# Altium footprint library PcbLib_ICs_part2.PcbLib: 66 footprints (part 4 of 5)
Each footprint in its own frame and in the unit in brackets; x right, y up, seen from the top. Pads: shape width x height; smd on the part's side, far side on the other; paste and mask are expansions set on the pad; w line width, h text height; cw(c..) or ccw(c..) is an arc to the next point about the centre after c.
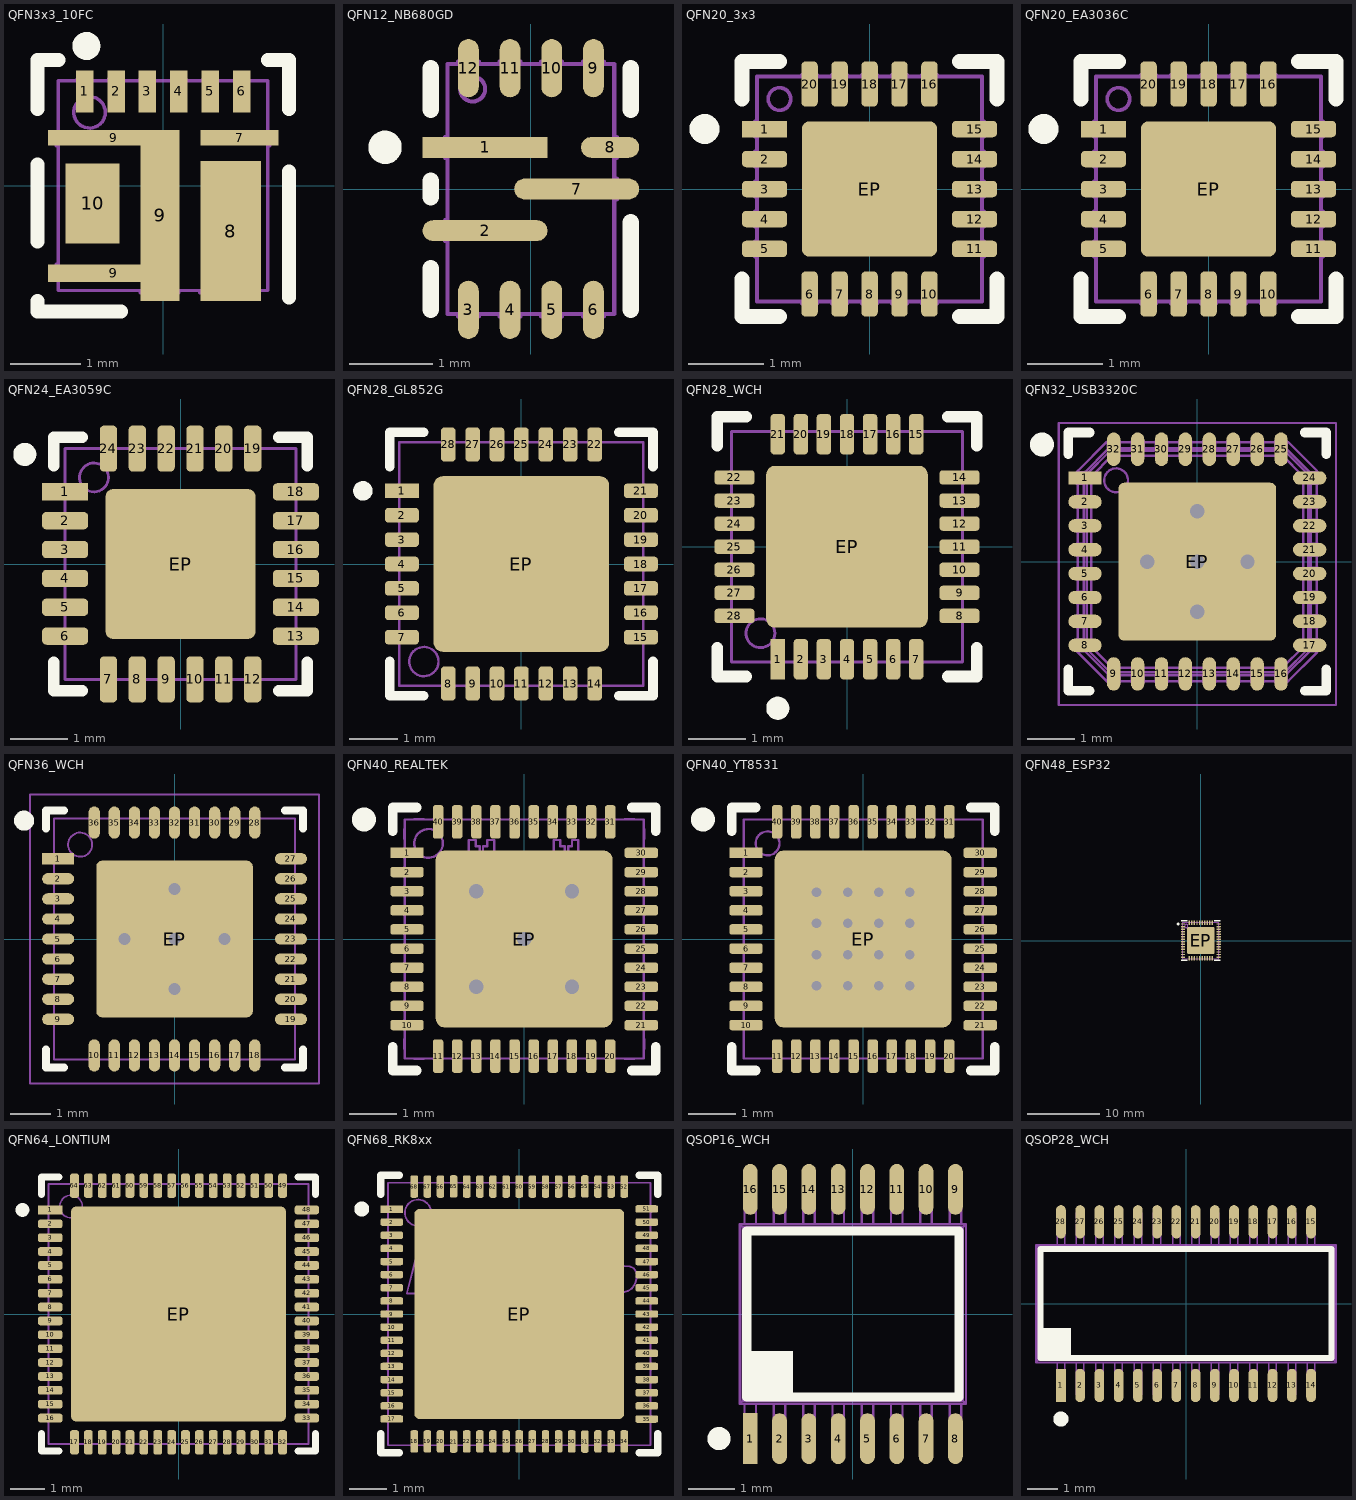
[diagram p3: the footprints below, top view; thin cyan lines are the x and y axes]

## QFN3x3_10FC [mm] "Power QFN 3mm x 3mm"
pads (12):
  rect 0.25x0.6 smd paste-0.025 mask+0.05: 1(-1.125,1.35) 2(-0.675,1.35) 3(-0.225,1.35) 4(0.225,1.35) 5(0.675,1.35) 6(1.125,1.35)
  rect 1.122x0.225 smd paste-0.025 mask+0.05: 7(1.093,0.687)
  rect 0.87x2 smd paste-3 mask+0.05: 8(0.967,-0.65)
  rect 1.88x0.25 smd paste-3 mask+0.05: 9(-0.71,-1.255)
  rect 1.88x0.225 smd paste-3 mask+0.05: 9(-0.71,0.687)
  rect 0.555x2.45 smd paste-3 mask+0.05: 9(-0.045,-0.425)
  rect 0.775x1.15 smd paste-3 mask+0.05: 10(-1.01,-0.255)
Top Overlay:
  circle w0.2: c-1.1,2 r0.1
  lines w0.2: -1.8,-1.65 -1.8,-1.8 -0.6,-1.8 ; -1.8,-0.8 -1.8,0.3 ; -1.8,1.1 -1.8,1.8 -1.5,1.8 ; 1.5,1.8 1.8,1.8 1.8,1.1 ; 1.8,-1.6 1.8,0.2
Top Paste:
  rectangle: -0.838,-1.357 -0.438,-1.157
  rectangle: -1.338,-1.357 -0.938,-1.157
  rectangle: -0.838,0.588 -0.438,0.788
  rectangle: -1.338,0.588 -0.938,0.788
  region: 1.3,-1.05 0.65,-1.05 0.65,-1.45 1.3,-1.45
  rectangle: 0.65,-0.85 1.3,-0.45
  rectangle: 0.65,-0.25 1.3,0.15
  rectangle: -0.25,-1.45 0.15,-1.05
  rectangle: -0.25,-0.85 0.15,-0.45
  rectangle: -0.25,-0.25 0.15,0.15
  rectangle: -0.25,0.35 0.15,0.75
  rectangle: -1.3,-0.75 -0.7,-0.35
  rectangle: -1.3,-0.15 -0.7,0.25
Top Assy:
  circle w0.05: c-1.053,1.049 r0.225
  lines w0.05: -1.503,-1.326 -1.533,-1.326 -1.533,-1.126 -1.503,-1.126 ; -1.503,0.574 -1.533,0.574 -1.533,0.774 -1.503,0.774 ; -1.228,1.499 -1.228,1.529 -1.028,1.529 -1.028,1.499 ; -0.778,1.499 -0.778,1.529 -0.578,1.529 -0.578,1.499 ; -0.328,-1.501 -0.328,-1.531 0.227,-1.531 0.227,-1.501 ; -0.328,1.499 -0.328,1.529 -0.128,1.529 -0.128,1.499 ; 0.122,1.499 0.122,1.529 0.322,1.529 0.322,1.499 ; 0.527,-1.501 0.527,-1.531 1.247,-1.531 1.247,-1.501 ; 0.572,1.499 0.572,1.529 0.772,1.529 0.772,1.499 ; 1.022,1.499 1.022,1.529 1.222,1.529 1.222,1.499 ; 1.497,0.574 1.527,0.574 1.527,0.774 1.497,0.774 ; -1.503,-1.501 -1.503,1.499 1.497,1.499 1.497,-1.501 -1.503,-1.501
  text ".Designator" at -3.443,-0.467 h2
3D body "QFN3x3_10_FC.STEP": height 0.85, standoff 0, extent -1.53,-1.53 1.53,1.53

## QFN12_NB680GD [mm] "Power QFN 2mm x 3mm"
pads (12):
  rect 1.5x0.25 smd paste-0.025 mask+0.05: 1(-0.55,0.5)
  oval 1.5x0.25 smd paste-0.025 mask+0.05: 2(-0.55,-0.5) 7(0.55,0)
  oval 0.25x0.7 smd paste-0.025 mask+0.05: 3(-0.75,-1.45) 4(-0.25,-1.45) 5(0.25,-1.45) 6(0.75,-1.45) 9(0.75,1.45) 10(0.25,1.45) 11(-0.25,1.45) 12(-0.75,1.45)
  oval 0.7x0.25 smd paste-0.025 mask+0.05: 8(0.95,0.5)
Top Overlay:
  circle w0.2: c-1.75,0.5 r0.1
  lines w0.2: -1.2,-1.45 -1.2,-0.95 ; -1.2,-0.1 -1.2,0.1 ; -1.2,0.95 -1.2,1.45 ; 1.2,-1.45 1.2,-0.4 ; 1.2,0.95 1.2,1.45
Top Assy:
  circle w0.05: c-0.7,1.2 r0.15
  lines w0.05: -1,-0.625 -1.03,-0.625 -1.03,-0.375 -1,-0.375 ; -1,0.375 -1.03,0.375 -1.03,0.625 -1,0.625 ; -0.875,-1.5 -0.875,-1.53 -0.625,-1.53 -0.625,-1.5 ; -0.875,1.5 -0.875,1.53 -0.625,1.53 -0.625,1.5 ; -0.375,-1.5 -0.375,-1.53 -0.125,-1.53 -0.125,-1.5 ; -0.375,1.5 -0.375,1.53 -0.125,1.53 -0.125,1.5 ; 0.125,-1.5 0.125,-1.53 0.375,-1.53 0.375,-1.5 ; 0.125,1.5 0.125,1.53 0.375,1.53 0.375,1.5 ; 0.625,-1.5 0.625,-1.53 0.875,-1.53 0.875,-1.5 ; 0.625,1.5 0.625,1.53 0.875,1.53 0.875,1.5 ; 1,-0.125 1.03,-0.125 1.03,0.125 1,0.125 ; 1,0.375 1.03,0.375 1.03,0.625 1,0.625 ; -1,-1.5 1,-1.5 1,1.5 -1,1.5 -1,-1.5
  text ".Designator" at 0.349,-2.579 h1.5
3D body "QFN-12(NB679).STEP": height 1, standoff 0, extent -1.03,-1.53 1.03,1.53

## QFN20_3x3 [mm] "Power QFN 3mm x 3mm, 0.4mm pitch"
pads (21):
  rect 0.6x0.22 smd paste-0.025 mask+0.05: 1(-1.4,0.8)
  rrect50% 0.6x0.22 smd paste-0.025 mask+0.05: 2(-1.4,0.4) 3(-1.4,0) 4(-1.4,-0.4) 5(-1.4,-0.8) 11(1.4,-0.8) 12(1.4,-0.4) 13(1.4,0) 14(1.4,0.4) 15(1.4,0.8)
  rrect50% 0.22x0.6 smd paste-0.025 mask+0.05: 6(-0.8,-1.4) 7(-0.4,-1.4) 8(0,-1.4) 9(0.4,-1.4) 10(0.8,-1.4) 16(0.8,1.4) 17(0.4,1.4) 18(0,1.4) 19(-0.4,1.4) 20(-0.8,1.4)
  rrect10% 1.8x1.8 smd paste-3 mask+0.05: EP(0,0)
Top Overlay:
  circle w0.2: c-2.2,0.8 r0.1
  lines w0.2: -1.7,-1.2 -1.7,-1.7 -1.2,-1.7 ; -1.7,1.2 -1.7,1.7 -1.2,1.7 ; 1.2,-1.7 1.7,-1.7 1.7,-1.2 ; 1.2,1.7 1.7,1.7 1.7,1.2
Top Paste:
  region: -0.1,-0.1 -0.7,-0.1 -0.7,-0.7 -0.1,-0.7
  region: 0.7,-0.1 0.1,-0.1 0.1,-0.7 0.7,-0.7
  region: -0.1,0.7 -0.7,0.7 -0.7,0.1 -0.1,0.1
  region: 0.7,0.7 0.1,0.7 0.1,0.1 0.7,0.1
Top Assy:
  circle w0.05: c-1.2,1.2 r0.15
  lines w0.05: -1.5,-0.9 -1.525,-0.9 -1.525,-0.7 -1.5,-0.7 ; -1.5,-0.5 -1.525,-0.5 -1.525,-0.3 -1.5,-0.3 ; -1.5,-0.1 -1.525,-0.1 -1.525,0.1 -1.5,0.1 ; -1.5,0.3 -1.525,0.3 -1.525,0.5 -1.5,0.5 ; -1.5,0.7 -1.525,0.7 -1.525,0.9 -1.5,0.9 ; -0.9,-1.5 -0.9,-1.525 -0.7,-1.525 -0.7,-1.5 ; -0.9,1.5 -0.9,1.525 -0.7,1.525 -0.7,1.5 ; -0.5,-1.5 -0.5,-1.525 -0.3,-1.525 -0.3,-1.5 ; -0.5,1.5 -0.5,1.525 -0.3,1.525 -0.3,1.5 ; -0.1,-1.5 -0.1,-1.525 0.1,-1.525 0.1,-1.5 ; -0.1,1.5 -0.1,1.525 0.1,1.525 0.1,1.5 ; 0.3,-1.5 0.3,-1.525 0.5,-1.525 0.5,-1.5 ; 0.3,1.5 0.3,1.525 0.5,1.525 0.5,1.5 ; 0.7,-1.5 0.7,-1.525 0.9,-1.525 0.9,-1.5 ; 0.7,1.5 0.7,1.525 0.9,1.525 0.9,1.5 ; 1.5,-0.9 1.525,-0.9 1.525,-0.7 1.5,-0.7 ; 1.5,-0.5 1.525,-0.5 1.525,-0.3 1.5,-0.3 ; 1.5,-0.1 1.525,-0.1 1.525,0.1 1.5,0.1 ; 1.5,0.3 1.525,0.3 1.525,0.5 1.5,0.5 ; 1.5,0.7 1.525,0.7 1.525,0.9 1.5,0.9 ; -1.5,-1.5 1.5,-1.5 1.5,1.5 -1.5,1.5 -1.5,-1.5
  text ".Designator" at -3.443,-0.467 h2
3D body "QFN-20_3x3.STEP": height 0.8, standoff 0, extent -1.525,-1.525 1.525,1.525

## QFN20_EA3036C [mm] "Power QFN 3mm x 3mm, 0.4mm pitch"
pads (21):
  rect 0.6x0.22 smd paste-0.025 mask+0.05: 1(-1.4,0.8)
  rrect50% 0.6x0.22 smd paste-0.025 mask+0.05: 2(-1.4,0.4) 3(-1.4,0) 4(-1.4,-0.4) 5(-1.4,-0.8) 11(1.4,-0.8) 12(1.4,-0.4) 13(1.4,0) 14(1.4,0.4) 15(1.4,0.8)
  rrect50% 0.22x0.6 smd paste-0.025 mask+0.05: 6(-0.8,-1.4) 7(-0.4,-1.4) 8(0,-1.4) 9(0.4,-1.4) 10(0.8,-1.4) 16(0.8,1.4) 17(0.4,1.4) 18(0,1.4) 19(-0.4,1.4) 20(-0.8,1.4)
  rrect10% 1.8x1.8 smd paste-3 mask+0.05: EP(0,0)
Top Overlay:
  circle w0.2: c-2.2,0.8 r0.1
  lines w0.2: -1.7,-1.2 -1.7,-1.7 -1.2,-1.7 ; -1.7,1.2 -1.7,1.7 -1.2,1.7 ; 1.2,-1.7 1.7,-1.7 1.7,-1.2 ; 1.2,1.7 1.7,1.7 1.7,1.2
Top Paste:
  region: -0.1,-0.1 -0.7,-0.1 -0.7,-0.7 -0.1,-0.7
  region: 0.7,-0.1 0.1,-0.1 0.1,-0.7 0.7,-0.7
  region: -0.1,0.7 -0.7,0.7 -0.7,0.1 -0.1,0.1
  region: 0.7,0.7 0.1,0.7 0.1,0.1 0.7,0.1
Top Assy:
  circle w0.05: c-1.2,1.2 r0.15
  lines w0.05: -1.5,-0.9 -1.525,-0.9 -1.525,-0.7 -1.5,-0.7 ; -1.5,-0.5 -1.525,-0.5 -1.525,-0.3 -1.5,-0.3 ; -1.5,-0.1 -1.525,-0.1 -1.525,0.1 -1.5,0.1 ; -1.5,0.3 -1.525,0.3 -1.525,0.5 -1.5,0.5 ; -1.5,0.7 -1.525,0.7 -1.525,0.9 -1.5,0.9 ; -0.9,-1.5 -0.9,-1.525 -0.7,-1.525 -0.7,-1.5 ; -0.9,1.5 -0.9,1.525 -0.7,1.525 -0.7,1.5 ; -0.5,-1.5 -0.5,-1.525 -0.3,-1.525 -0.3,-1.5 ; -0.5,1.5 -0.5,1.525 -0.3,1.525 -0.3,1.5 ; -0.1,-1.5 -0.1,-1.525 0.1,-1.525 0.1,-1.5 ; -0.1,1.5 -0.1,1.525 0.1,1.525 0.1,1.5 ; 0.3,-1.5 0.3,-1.525 0.5,-1.525 0.5,-1.5 ; 0.3,1.5 0.3,1.525 0.5,1.525 0.5,1.5 ; 0.7,-1.5 0.7,-1.525 0.9,-1.525 0.9,-1.5 ; 0.7,1.5 0.7,1.525 0.9,1.525 0.9,1.5 ; 1.5,-0.9 1.525,-0.9 1.525,-0.7 1.5,-0.7 ; 1.5,-0.5 1.525,-0.5 1.525,-0.3 1.5,-0.3 ; 1.5,-0.1 1.525,-0.1 1.525,0.1 1.5,0.1 ; 1.5,0.3 1.525,0.3 1.525,0.5 1.5,0.5 ; 1.5,0.7 1.525,0.7 1.525,0.9 1.5,0.9 ; -1.5,-1.5 1.5,-1.5 1.5,1.5 -1.5,1.5 -1.5,-1.5
  text ".Designator" at -3.443,-0.467 h2
3D body "QFN-20_EA3036C.x_t": height 0.8, standoff 0, extent -1.525,-1.525 1.525,1.525

## QFN24_EA3059C [mm] "Power QFN 4mm x 4mm, 0.5mm pitch"
pads (25):
  rect 0.8x0.3 smd paste-0.025 mask+0.05: 1(-2,1.25)
  rrect50% 0.8x0.3 smd paste-0.025 mask+0.05: 2(-2,0.75) 3(-2,0.25) 4(-2,-0.25) 5(-2,-0.75) 6(-2,-1.25) 13(2,-1.25) 14(2,-0.75) 15(2,-0.25) 16(2,0.25) 17(2,0.75) 18(2,1.25)
  rrect50% 0.3x0.8 smd paste-0.025 mask+0.05: 7(-1.25,-2) 8(-0.75,-2) 9(-0.25,-2) 10(0.25,-2) 11(0.75,-2) 12(1.25,-2) 19(1.25,2) 20(0.75,2) 21(0.25,2) 22(-0.25,2) 23(-0.75,2) 24(-1.25,2)
  rrect10% 2.6x2.6 smd paste-3 mask+0.05: EP(0,0)
Top Overlay:
  circle w0.2: c-2.7,1.9 r0.1
  lines w0.2: -2.2,-1.7 -2.2,-2.2 -1.7,-2.2 ; -2.2,1.7 -2.2,2.2 -1.7,2.2 ; 1.7,-2.2 2.2,-2.2 2.2,-1.7 ; 1.7,2.2 2.2,2.2 2.2,1.7
Top Paste:
  region: 1.1,-1.1 1.1,-0.5 0.5,-0.5 0.5,-1.1
  region: 0.3,-1.1 0.3,-0.5 -0.3,-0.5 -0.3,-1.1
  region: -0.5,-1.1 -0.5,-0.5 -1.1,-0.5 -1.1,-1.1
  region: 1.1,0.3 0.5,0.3 0.5,-0.3 1.1,-0.3
  region: 1.1,1.1 0.5,1.1 0.5,0.5 1.1,0.5
  region: 0.3,1.1 -0.3,1.1 -0.3,0.5 0.3,0.5
  region: -0.5,1.1 -1.1,1.1 -1.1,0.5 -0.5,0.5
  region: 0.3,0.3 -0.3,0.3 -0.3,-0.3 0.3,-0.3
  region: -0.5,0.3 -1.1,0.3 -1.1,-0.3 -0.5,-0.3
Top Assy:
  circle w0.05: c-1.5,1.5 r0.25
  lines w0.05: -2,-1.37 -2.025,-1.37 -2.025,-1.13 -2,-1.13 ; -2,-0.87 -2.025,-0.87 -2.025,-0.63 -2,-0.63 ; -2,-0.37 -2.025,-0.37 -2.025,-0.13 -2,-0.13 ; -2,0.13 -2.025,0.13 -2.025,0.37 -2,0.37 ; -2,0.63 -2.025,0.63 -2.025,0.87 -2,0.87 ; -2,1.13 -2.025,1.13 -2.025,1.37 -2,1.37 ; -1.37,-2 -1.37,-2.025 -1.13,-2.025 -1.13,-2 ; -1.37,2 -1.37,2.025 -1.13,2.025 -1.13,2 ; -0.87,-2 -0.87,-2.025 -0.63,-2.025 -0.63,-2 ; -0.87,2 -0.87,2.025 -0.63,2.025 -0.63,2 ; -0.37,-2 -0.37,-2.025 -0.13,-2.025 -0.13,-2 ; -0.37,2 -0.37,2.025 -0.13,2.025 -0.13,2 ; 0.13,-2 0.13,-2.025 0.37,-2.025 0.37,-2 ; 0.13,2 0.13,2.025 0.37,2.025 0.37,2 ; 0.63,-2 0.63,-2.025 0.87,-2.025 0.87,-2 ; 0.63,2 0.63,2.025 0.87,2.025 0.87,2 ; 1.13,-2 1.13,-2.025 1.37,-2.025 1.37,-2 ; 1.13,2 1.13,2.025 1.37,2.025 1.37,2 ; 2,-1.37 2.025,-1.37 2.025,-1.13 2,-1.13 ; 2,-0.87 2.025,-0.87 2.025,-0.63 2,-0.63 ; 2,-0.37 2.025,-0.37 2.025,-0.13 2,-0.13 ; 2,0.13 2.025,0.13 2.025,0.37 2,0.37 ; 2,0.63 2.025,0.63 2.025,0.87 2,0.87 ; 2,1.13 2.025,1.13 2.025,1.37 2,1.37 ; -2,-2 2,-2 2,2 -2,2 -2,-2
  text ".Designator" at -3.443,-0.467 h2
3D body "QFN24_EA3059C.x_t": height 0.9, standoff 0, extent -2.025,-2.025 2.025,2.025

## QFN28_GL852G [mm] "QFN 5mm x 5mm, 0.5mm pitch"
pads (29):
  rect 0.7x0.3 smd paste-0.025 mask+0.05: 1(-2.45,1.5)
  rrect50% 0.7x0.3 smd paste-0.025 mask+0.05: 2(-2.45,1) 3(-2.45,0.5) 4(-2.45,0) 5(-2.45,-0.5) 6(-2.45,-1) 7(-2.45,-1.5) 15(2.45,-1.5) 16(2.45,-1) 17(2.45,-0.5) 18(2.45,0) 19(2.45,0.5) 20(2.45,1) 21(2.45,1.5)
  rrect50% 0.3x0.7 smd paste-0.025 mask+0.05: 8(-1.5,-2.45) 9(-1,-2.45) 10(-0.5,-2.45) 11(0,-2.45) 12(0.5,-2.45) 13(1,-2.45) 14(1.5,-2.45) 22(1.5,2.45) 23(1,2.45) 24(0.5,2.45) 25(0,2.45) 26(-0.5,2.45) 27(-1,2.45) 28(-1.5,2.45)
  rrect10% 3.6x3.6 smd paste-3 mask+0.05: EP(0,0)
Top Overlay:
  circle w0.2: c-3.25,1.5 r0.1
  lines w0.2: -2.7,-2 -2.7,-2.7 -2,-2.7 ; -2.7,2 -2.7,2.7 -2,2.7 ; 2,-2.7 2.7,-2.7 2.7,-2 ; 2,2.7 2.7,2.7 2.7,2
Top Paste:
  region: -0.5,0.3 -1.1,0.3 -1.1,-0.3 -0.5,-0.3
  region: 0.3,0.3 -0.3,0.3 -0.3,-0.3 0.3,-0.3
  region: -0.5,1.1 -1.1,1.1 -1.1,0.5 -0.5,0.5
  region: 0.3,1.1 -0.3,1.1 -0.3,0.5 0.3,0.5
  region: 1.1,1.1 0.5,1.1 0.5,0.5 1.1,0.5
  region: 1.1,0.3 0.5,0.3 0.5,-0.3 1.1,-0.3
  region: -0.5,-1.1 -0.5,-0.5 -1.1,-0.5 -1.1,-1.1
  region: 0.3,-1.1 0.3,-0.5 -0.3,-0.5 -0.3,-1.1
  region: 1.1,-1.1 1.1,-0.5 0.5,-0.5 0.5,-1.1
Top Assy:
  circle w0.05: c-2,-2 r0.3
  lines w0.05: -2.5,-1.625 -2.525,-1.625 -2.525,-1.375 -2.5,-1.375 ; -2.5,-1.125 -2.525,-1.125 -2.525,-0.875 -2.5,-0.875 ; -2.5,-0.625 -2.525,-0.625 -2.525,-0.375 -2.5,-0.375 ; -2.5,-0.125 -2.525,-0.125 -2.525,0.125 -2.5,0.125 ; -2.5,0.375 -2.525,0.375 -2.525,0.625 -2.5,0.625 ; -2.5,0.875 -2.525,0.875 -2.525,1.125 -2.5,1.125 ; -2.5,1.375 -2.525,1.375 -2.525,1.625 -2.5,1.625 ; -1.625,-2.5 -1.625,-2.525 -1.375,-2.525 -1.375,-2.5 ; -1.625,2.5 -1.625,2.525 -1.375,2.525 -1.375,2.5 ; -1.125,-2.5 -1.125,-2.525 -0.875,-2.525 -0.875,-2.5 ; -1.125,2.5 -1.125,2.525 -0.875,2.525 -0.875,2.5 ; -0.625,-2.5 -0.625,-2.525 -0.375,-2.525 -0.375,-2.5 ; -0.625,2.5 -0.625,2.525 -0.375,2.525 -0.375,2.5 ; -0.125,-2.5 -0.125,-2.525 0.125,-2.525 0.125,-2.5 ; -0.125,2.5 -0.125,2.525 0.125,2.525 0.125,2.5 ; 0.375,-2.5 0.375,-2.525 0.625,-2.525 0.625,-2.5 ; 0.375,2.5 0.375,2.525 0.625,2.525 0.625,2.5 ; 0.875,-2.5 0.875,-2.525 1.125,-2.525 1.125,-2.5 ; 0.875,2.5 0.875,2.525 1.125,2.525 1.125,2.5 ; 1.375,-2.5 1.375,-2.525 1.625,-2.525 1.625,-2.5 ; 1.375,2.5 1.375,2.525 1.625,2.525 1.625,2.5 ; 2.5,-1.625 2.525,-1.625 2.525,-1.375 2.5,-1.375 ; 2.5,-1.125 2.525,-1.125 2.525,-0.875 2.5,-0.875 ; 2.5,-0.625 2.525,-0.625 2.525,-0.375 2.5,-0.375 ; 2.5,-0.125 2.525,-0.125 2.525,0.125 2.5,0.125 ; 2.5,0.375 2.525,0.375 2.525,0.625 2.5,0.625 ; 2.5,0.875 2.525,0.875 2.525,1.125 2.5,1.125 ; 2.5,1.375 2.525,1.375 2.525,1.625 2.5,1.625 ; -2.5,-2.5 -2.5,2.5 2.5,2.5 2.5,-2.5 -2.5,-2.5
  text ".Designator" at -3.443,-0.467 h2
3D body "QFN28_GL852G.x_t": height 0.85, standoff 0, extent -2.525,-2.525 2.525,2.525

## QFN28_WCH [mm] "QFN 4mm x 4mm, 0.4mm pitch"
height 0.8
pads (29):
  rect 0.25x0.7 smd paste-0.025 mask+0.05: 1(-1.2,-1.95)
  rrect50% 0.25x0.7 smd paste-0.025 mask+0.05: 2(-0.8,-1.95) 3(-0.4,-1.95) 4(0,-1.95) 5(0.4,-1.95) 6(0.8,-1.95) 7(1.2,-1.95) 15(1.2,1.95) 16(0.8,1.95) 17(0.4,1.95) 18(0,1.95) 19(-0.4,1.95) 20(-0.8,1.95) 21(-1.2,1.95)
  rrect50% 0.7x0.25 smd paste-0.025 mask+0.05: 8(1.95,-1.2) 9(1.95,-0.8) 10(1.95,-0.4) 11(1.95,0) 12(1.95,0.4) 13(1.95,0.8) 14(1.95,1.2) 22(-1.95,1.2) 23(-1.95,0.8) 24(-1.95,0.4) 25(-1.95,0) 26(-1.95,-0.4) 27(-1.95,-0.8) 28(-1.95,-1.2)
  rrect10% 2.8x2.8 smd paste-3 mask+0.05: EP(0,0)
Top Overlay:
  circle w0.2: c-1.2,-2.8 r0.1
  lines w0.2: -2.25,-1.75 -2.25,-2.25 -1.75,-2.25 ; -2.25,1.75 -2.25,2.25 -1.75,2.25 ; 1.75,-2.25 2.25,-2.25 2.25,-1.75 ; 1.75,2.25 2.25,2.25 2.25,1.75
Top Paste:
  region: 1.1,-1.1 1.1,-0.5 0.5,-0.5 0.5,-1.1
  region: 0.3,-1.1 0.3,-0.5 -0.3,-0.5 -0.3,-1.1
  region: -0.5,-1.1 -0.5,-0.5 -1.1,-0.5 -1.1,-1.1
  region: 1.1,0.3 0.5,0.3 0.5,-0.3 1.1,-0.3
  region: 1.1,1.1 0.5,1.1 0.5,0.5 1.1,0.5
  region: 0.3,1.1 -0.3,1.1 -0.3,0.5 0.3,0.5
  region: -0.5,1.1 -1.1,1.1 -1.1,0.5 -0.5,0.5
  region: 0.3,0.3 -0.3,0.3 -0.3,-0.3 0.3,-0.3
  region: -0.5,0.3 -1.1,0.3 -1.1,-0.3 -0.5,-0.3
Top Assy:
  circle w0.05: c-1.5,-1.5 r0.25
  lines w0.05: -2,-1.3 -2.025,-1.3 -2.025,-1.1 -2,-1.1 ; -2,-0.9 -2.025,-0.9 -2.025,-0.7 -2,-0.7 ; -2,-0.5 -2.025,-0.5 -2.025,-0.3 -2,-0.3 ; -2,-0.1 -2.025,-0.1 -2.025,0.1 -2,0.1 ; -2,0.3 -2.025,0.3 -2.025,0.5 -2,0.5 ; -2,0.7 -2.025,0.7 -2.025,0.9 -2,0.9 ; -2,1.1 -2.025,1.1 -2.025,1.3 -2,1.3 ; -1.3,-2 -1.3,-2.025 -1.1,-2.025 -1.1,-2 ; -1.3,2 -1.3,2.025 -1.1,2.025 -1.1,2 ; -0.9,-2 -0.9,-2.025 -0.7,-2.025 -0.7,-2 ; -0.9,2 -0.9,2.025 -0.7,2.025 -0.7,2 ; -0.5,-2 -0.5,-2.025 -0.3,-2.025 -0.3,-2 ; -0.5,2 -0.5,2.025 -0.3,2.025 -0.3,2 ; -0.1,-2 -0.1,-2.025 0.1,-2.025 0.1,-2 ; -0.1,2 -0.1,2.025 0.1,2.025 0.1,2 ; 0.3,-2 0.3,-2.025 0.5,-2.025 0.5,-2 ; 0.3,2 0.3,2.025 0.5,2.025 0.5,2 ; 0.7,-2 0.7,-2.025 0.9,-2.025 0.9,-2 ; 0.7,2 0.7,2.025 0.9,2.025 0.9,2 ; 1.1,-2 1.1,-2.025 1.3,-2.025 1.3,-2 ; 1.1,2 1.1,2.025 1.3,2.025 1.3,2 ; 2,-1.3 2.025,-1.3 2.025,-1.1 2,-1.1 ; 2,-0.9 2.025,-0.9 2.025,-0.7 2,-0.7 ; 2,-0.5 2.025,-0.5 2.025,-0.3 2,-0.3 ; 2,-0.1 2.025,-0.1 2.025,0.1 2,0.1 ; 2,0.3 2.025,0.3 2.025,0.5 2,0.5 ; 2,0.7 2.025,0.7 2.025,0.9 2,0.9 ; 2,1.1 2.025,1.1 2.025,1.3 2,1.3 ; -2,-2 -2,2 2,2 2,-2 -2,-2
  text ".Designator" at -3.443,-0.467 h2
3D body "QFN28_WCH.x_t": height 0.78, standoff 0, extent -2.025,-2.025 2.025,2.025

## QFN32_USB3320C [mm] "QFN-32 with 0.5mm pitch"
height 1
pads (33):
  rect 0.7x0.28 smd paste+0 mask+0.05: 1(-2.35,1.75)
  oval 0.7x0.28 smd paste+0 mask+0.05: 2(-2.35,1.25) 3(-2.35,0.75) 4(-2.35,0.25) 5(-2.35,-0.25) 6(-2.35,-0.75) 7(-2.35,-1.25) 8(-2.35,-1.75) 17(2.35,-1.75) 18(2.35,-1.25) 19(2.35,-0.75) 20(2.35,-0.25) 21(2.35,0.25) 22(2.35,0.75) 23(2.35,1.25) 24(2.35,1.75)
  oval 0.28x0.7 smd paste+0 mask+0.05: 9(-1.75,-2.35) 10(-1.25,-2.35) 11(-0.75,-2.35) 12(-0.25,-2.35) 13(0.25,-2.35) 14(0.75,-2.35) 15(1.25,-2.35) 16(1.75,-2.35) 25(1.75,2.35) 26(1.25,2.35) 27(0.75,2.35) 28(0.25,2.35) 29(-0.25,2.35) 30(-0.75,2.35) 31(-1.25,2.35) 32(-1.75,2.35)
  rrect7% 3.3x3.3 smd paste-10 mask+0.05: EP(0,0)
via -1.05,0 diameter 0.7 hole 0.3
via 0,1.05 diameter 0.7 hole 0.3
via 0,-1.05 diameter 0.7 hole 0.3
via 0,0 diameter 0.7 hole 0.3
via 1.05,0 diameter 0.7 hole 0.3
Top Overlay:
  circle w0.25: c-3.25,2.45 r0.125
  lines w0.2: -2.7,-2.25 -2.7,-2.7 -2.25,-2.7 ; -2.7,2.25 -2.7,2.7 -2.25,2.7 ; 2.25,-2.7 2.7,-2.7 2.7,-2.25 ; 2.25,2.7 2.7,2.7 2.7,2.25
Top Paste:
  rectangle: 0.9,-1.5 1.5,-0.9
  rectangle: -1.5,-1.5 -0.9,-0.9
  rectangle: -0.7,-1.5 -0.1,-0.9
  rectangle: 0.1,-1.5 0.7,-0.9
  region: -0.9,1.5 -1.5,1.5 -1.5,0.9 -0.9,0.9
  region: 1.5,1.5 0.9,1.5 0.9,0.9 1.5,0.9
  region: 0.7,1.5 0.1,1.5 0.1,0.9 0.7,0.9
  region: -0.1,1.5 -0.7,1.5 -0.7,0.9 -0.1,0.9
  region: -0.9,0.7 -1.5,0.7 -1.5,0.1 -0.9,0.1
  region: 1.5,0.7 0.9,0.7 0.9,0.1 1.5,0.1
  region: 0.7,0.7 0.1,0.7 0.1,0.1 0.7,0.1
  region: -0.1,0.7 -0.7,0.7 -0.7,0.1 -0.1,0.1
  rectangle: 0.9,-0.7 1.5,-0.1
  rectangle: -1.5,-0.7 -0.9,-0.1
  rectangle: -0.7,-0.7 -0.1,-0.1
  rectangle: 0.1,-0.7 0.7,-0.1
Bottom Solder:
  region: -1.8,1.8 -0.3,1.8 0,1.5 0.3,1.8 1.8,1.8 1.8,0.3 1.5,0 1.8,-0.3 1.8,-1.8 0.3,-1.8 0,-1.5 -0.3,-1.8 -1.8,-1.8 -1.8,-0.3 -1.5,0 -1.8,0.3
Top Assy:
  drawing of 273 lines, arcs and shapes, not listed
  text ".Designator" at -3.443,-0.467 h2
Top Text:
  lines w0.05: -2.9,-3 -2.9,2.9 2.9,2.9 2.9,-3 -2.9,-3
  lines w0.1: -0.5,0 0.5,0 ; 0,-0.5 0,0.5
3D body "QFN-32_USB3320C.x_t": height 0.85, standoff 0, extent -2.52,-2.52 2.52,2.52

## QFN36_WCH [mm] "QFN-36 with 0.5mm pitch"
height 1
pads (37):
  rect 0.8x0.28 smd paste+0 mask+0.05: 1(-2.9,2)
  oval 0.8x0.28 smd paste+0 mask+0.05: 2(-2.9,1.5) 3(-2.9,1) 4(-2.9,0.5) 5(-2.9,0) 6(-2.9,-0.5) 7(-2.9,-1) 8(-2.9,-1.5) 9(-2.9,-2) 19(2.9,-2) 20(2.9,-1.5) 21(2.9,-1) 22(2.9,-0.5) 23(2.9,0) 24(2.9,0.5) 25(2.9,1) 26(2.9,1.5) 27(2.9,2)
  oval 0.28x0.8 smd paste+0 mask+0.05: 10(-2,-2.9) 11(-1.5,-2.9) 12(-1,-2.9) 13(-0.5,-2.9) 14(0,-2.9) 15(0.5,-2.9) 16(1,-2.9) 17(1.5,-2.9) 18(2,-2.9) 28(2,2.9) 29(1.5,2.9) 30(1,2.9) 31(0.5,2.9) 32(0,2.9) 33(-0.5,2.9) 34(-1,2.9) 35(-1.5,2.9) 36(-2,2.9)
  rrect7% 3.9x3.9 smd paste-10 mask+0.05: EP(0,0)
via 0,-1.25 diameter 0.7 hole 0.3
via -1.25,0 diameter 0.7 hole 0.3
via 0,1.25 diameter 0.7 hole 0.3
via 0,0 diameter 0.7 hole 0.3
via 1.25,0 diameter 0.7 hole 0.3
Top Overlay:
  circle w0.25: c-3.75,2.95 r0.125
  lines w0.2: -3.2,-2.75 -3.2,-3.2 -2.75,-3.2 ; -3.2,2.75 -3.2,3.2 -2.75,3.2 ; 2.75,-3.2 3.2,-3.2 3.2,-2.75 ; 2.75,3.2 3.2,3.2 3.2,2.75
Top Paste:
  rectangle: 0.9,-1.5 1.5,-0.9
  rectangle: -1.5,-1.5 -0.9,-0.9
  rectangle: -0.7,-1.5 -0.1,-0.9
  rectangle: 0.1,-1.5 0.7,-0.9
  region: -0.9,1.5 -1.5,1.5 -1.5,0.9 -0.9,0.9
  region: 1.5,1.5 0.9,1.5 0.9,0.9 1.5,0.9
  region: 0.7,1.5 0.1,1.5 0.1,0.9 0.7,0.9
  region: -0.1,1.5 -0.7,1.5 -0.7,0.9 -0.1,0.9
  region: -0.9,0.7 -1.5,0.7 -1.5,0.1 -0.9,0.1
  region: 1.5,0.7 0.9,0.7 0.9,0.1 1.5,0.1
  region: 0.7,0.7 0.1,0.7 0.1,0.1 0.7,0.1
  region: -0.1,0.7 -0.7,0.7 -0.7,0.1 -0.1,0.1
  rectangle: 0.9,-0.7 1.5,-0.1
  rectangle: -1.5,-0.7 -0.9,-0.1
  rectangle: -0.7,-0.7 -0.1,-0.1
  rectangle: 0.1,-0.7 0.7,-0.1
Bottom Solder:
  region: -1.95,1.95 -0.25,1.95 0,1.7 0.25,1.95 1.95,1.95 1.95,0.25 1.7,0 1.95,-0.25 1.95,-1.95 0.25,-1.95 0,-1.7 -0.25,-1.95 -1.95,-1.95 -1.95,-0.25 -1.7,0 -1.95,0.25
Top Assy:
  drawing of 168 lines, arcs and shapes, not listed
  text ".Designator" at -3.443,-1.967 h2
Top Text:
  lines w0.05: -3.6,-3.6 -3.6,3.6 3.6,3.6 3.6,-3.6 -3.6,-3.6
  lines w0.1: -0.5,0 0.5,0 ; 0,-0.5 0,0.5
3D body "QFN-36_WCH.x_t": height 0.82, standoff -0.01, extent -3.025,-3.025 3.025,3.025

## QFN40_REALTEK [mm]
pads (41):
  rect 0.7x0.22 smd paste+0 mask+0.05: 1(-2.45,1.8)
  rrect50% 0.7x0.22 smd paste+0 mask+0.05: 2(-2.45,1.4) 3(-2.45,1) 4(-2.45,0.6) 5(-2.45,0.2) 6(-2.45,-0.2) 7(-2.45,-0.6) 8(-2.45,-1) 9(-2.45,-1.4) 10(-2.45,-1.8) 21(2.45,-1.8) 22(2.45,-1.4) 23(2.45,-1) 24(2.45,-0.6) 25(2.45,-0.2) 26(2.45,0.2) 27(2.45,0.6) 28(2.45,1) 29(2.45,1.4) 30(2.45,1.8)
  rrect50% 0.22x0.7 smd paste+0 mask+0.05: 11(-1.8,-2.45) 12(-1.4,-2.45) 13(-1,-2.45) 14(-0.6,-2.45) 15(-0.2,-2.45) 16(0.2,-2.45) 17(0.6,-2.45) 18(1,-2.45) 19(1.4,-2.45) 20(1.8,-2.45) 31(1.8,2.45) 32(1.4,2.45) 33(1,2.45) 34(0.6,2.45) 35(0.2,2.45) 36(-0.2,2.45) 37(-0.6,2.45) 38(-1,2.45) 39(-1.4,2.45) 40(-1.8,2.45)
  rrect10% 3.7x3.7 smd paste-10 mask+0.05: EP(0,0)
via 1,-1 diameter 0.7 hole 0.3
via -1,-1 diameter 0.7 hole 0.3
via -1,1 diameter 0.7 hole 0.3
via 1,1 diameter 0.7 hole 0.3
via 0,0 diameter 0.7 hole 0.3
Top Overlay:
  circle w0.25: c-3.35,2.5 r0.125
  lines w0.2: -2.75,-2.25 -2.75,-2.75 -2.25,-2.75 ; -2.75,2.25 -2.75,2.75 -2.25,2.75 ; 2.25,-2.75 2.75,-2.75 2.75,-2.25 ; 2.25,2.75 2.75,2.75 2.75,2.25
Top Paste:
  rectangle: 1.225,-1.775 1.775,-1.225
  rectangle: -1.775,-1.775 -1.225,-1.225
  rectangle: -1.025,-1.775 -0.475,-1.225
  rectangle: -0.275,-1.775 0.275,-1.225
  rectangle: 0.475,-1.775 1.025,-1.225
  rectangle: 1.225,1.225 1.775,1.775
  rectangle: 1.225,0.475 1.775,1.025
  rectangle: 1.225,-1.025 1.775,-0.475
  rectangle: 1.225,-0.275 1.775,0.275
  rectangle: -1.775,1.225 -1.225,1.775
  rectangle: -1.025,1.225 -0.475,1.775
  rectangle: -0.275,1.225 0.275,1.775
  rectangle: 0.475,1.225 1.025,1.775
  rectangle: 0.475,0.475 1.025,1.025
  rectangle: -0.275,0.475 0.275,1.025
  rectangle: -1.025,0.475 -0.475,1.025
  rectangle: -1.775,0.475 -1.225,1.025
  rectangle: -1.775,-1.025 -1.225,-0.475
  rectangle: -1.025,-1.025 -0.475,-0.475
  rectangle: -0.275,-1.025 0.275,-0.475
  rectangle: 0.475,-1.025 1.025,-0.475
  rectangle: 0.475,-0.275 1.025,0.275
  rectangle: -0.275,-0.275 0.275,0.275
  rectangle: -1.025,-0.275 -0.475,0.275
  rectangle: -1.775,-0.275 -1.225,0.275
Bottom Solder:
  region: -1.75,1.75 -0.5,1.75 0,1.25 0.5,1.75 1.75,1.75 1.75,0.5 1.25,0 1.75,-0.5 1.75,-1.75 0.5,-1.75 0,-1.25 -0.5,-1.75 -1.75,-1.749 -1.75,-0.5 -1.25,0 -1.75,0.5
Top Assy:
  drawing of 376 lines, arcs and shapes, not listed
  text ".Designator" at -3.443,-1.717 h2
Top Text:
  lines w0.1: -0.5,0 0.5,0 ; 0,-0.5 0,0.5
3D body "QFN40_REALTEK.STEP": height 0.85, standoff 0, extent -2.51,-2.51 2.51,2.51

## QFN40_YT8531 [mm]
pads (41):
  rect 0.7x0.22 smd paste+0 mask+0.05: 1(-2.45,1.8)
  rrect50% 0.7x0.22 smd paste+0 mask+0.05: 2(-2.45,1.4) 3(-2.45,1) 4(-2.45,0.6) 5(-2.45,0.2) 6(-2.45,-0.2) 7(-2.45,-0.6) 8(-2.45,-1) 9(-2.45,-1.4) 10(-2.45,-1.8) 21(2.45,-1.8) 22(2.45,-1.4) 23(2.45,-1) 24(2.45,-0.6) 25(2.45,-0.2) 26(2.45,0.2) 27(2.45,0.6) 28(2.45,1) 29(2.45,1.4) 30(2.45,1.8)
  rrect50% 0.22x0.7 smd paste+0 mask+0.05: 11(-1.8,-2.45) 12(-1.4,-2.45) 13(-1,-2.45) 14(-0.6,-2.45) 15(-0.2,-2.45) 16(0.2,-2.45) 17(0.6,-2.45) 18(1,-2.45) 19(1.4,-2.45) 20(1.8,-2.45) 31(1.8,2.45) 32(1.4,2.45) 33(1,2.45) 34(0.6,2.45) 35(0.2,2.45) 36(-0.2,2.45) 37(-0.6,2.45) 38(-1,2.45) 39(-1.4,2.45) 40(-1.8,2.45)
  rrect10% 3.7x3.7 smd paste-10 mask+0.05: EP(0,0)
via -0.325,-0.975 diameter 0.4 hole 0.2
via 0.325,-0.975 diameter 0.4 hole 0.2
via 0.975,-0.975 diameter 0.4 hole 0.2
via -0.975,-0.975 diameter 0.4 hole 0.2
via -0.325,-0.325 diameter 0.4 hole 0.2
via 0.325,-0.325 diameter 0.4 hole 0.2
via 0.975,-0.325 diameter 0.4 hole 0.2
via -0.975,-0.325 diameter 0.4 hole 0.2
via -0.325,0.325 diameter 0.4 hole 0.2
via 0.325,0.325 diameter 0.4 hole 0.2
via 0.975,0.325 diameter 0.4 hole 0.2
via -0.975,0.325 diameter 0.4 hole 0.2
via -0.325,0.975 diameter 0.4 hole 0.2
via 0.325,0.975 diameter 0.4 hole 0.2
via 0.975,0.975 diameter 0.4 hole 0.2
via -0.975,0.975 diameter 0.4 hole 0.2
Top Overlay:
  circle w0.25: c-3.35,2.5 r0.125
  lines w0.2: -2.75,-2.25 -2.75,-2.75 -2.25,-2.75 ; -2.75,2.25 -2.75,2.75 -2.25,2.75 ; 2.25,-2.75 2.75,-2.75 2.75,-2.25 ; 2.25,2.75 2.75,2.75 2.75,2.25
Top Paste:
  rectangle: 1.225,-1.775 1.775,-1.225
  rectangle: -1.775,-1.775 -1.225,-1.225
  rectangle: -1.025,-1.775 -0.475,-1.225
  rectangle: -0.275,-1.775 0.275,-1.225
  rectangle: 0.475,-1.775 1.025,-1.225
  rectangle: 1.225,1.225 1.775,1.775
  rectangle: 1.225,0.475 1.775,1.025
  rectangle: 1.225,-1.025 1.775,-0.475
  rectangle: 1.225,-0.275 1.775,0.275
  rectangle: -1.775,1.225 -1.225,1.775
  rectangle: -1.025,1.225 -0.475,1.775
  rectangle: -0.275,1.225 0.275,1.775
  rectangle: 0.475,1.225 1.025,1.775
  rectangle: 0.475,0.475 1.025,1.025
  rectangle: -0.275,0.475 0.275,1.025
  rectangle: -1.025,0.475 -0.475,1.025
  rectangle: -1.775,0.475 -1.225,1.025
  rectangle: -1.775,-1.025 -1.225,-0.475
  rectangle: -1.025,-1.025 -0.475,-0.475
  rectangle: -0.275,-1.025 0.275,-0.475
  rectangle: 0.475,-1.025 1.025,-0.475
  rectangle: 0.475,-0.275 1.025,0.275
  rectangle: -0.275,-0.275 0.275,0.275
  rectangle: -1.025,-0.275 -0.475,0.275
  rectangle: -1.775,-0.275 -1.225,0.275
Bottom Solder:
  region: -1.75,1.75 -0.35,1.75 0,1.4 0.35,1.75 1.75,1.75 1.75,0.35 1.4,0 1.75,-0.35 1.75,-1.75 0.35,-1.75 0,-1.4 -0.35,-1.75 -1.75,-1.749 -1.75,-0.35 -1.4,0 -1.75,0.35
Top Assy:
  circle w0.05: c-2,2 r0.25
  lines w0.05: -2.5,-1.875 -2.52,-1.875 -2.52,-1.725 -2.5,-1.725 ; -2.5,-1.475 -2.52,-1.475 -2.52,-1.325 -2.5,-1.325 ; -2.5,-1.075 -2.52,-1.075 -2.52,-0.925 -2.5,-0.925 ; -2.5,-0.675 -2.52,-0.675 -2.52,-0.525 -2.5,-0.525 ; -2.5,-0.275 -2.52,-0.275 -2.52,-0.125 -2.5,-0.125 ; -2.5,0.125 -2.52,0.125 -2.52,0.275 -2.5,0.275 ; -2.5,0.525 -2.52,0.525 -2.52,0.675 -2.5,0.675 ; -2.5,0.925 -2.52,0.925 -2.52,1.075 -2.5,1.075 ; -2.5,1.325 -2.52,1.325 -2.52,1.475 -2.5,1.475 ; -2.5,1.725 -2.52,1.725 -2.52,1.875 -2.5,1.875 ; -1.875,-2.5 -1.875,-2.52 -1.725,-2.52 -1.725,-2.5 ; -1.875,2.5 -1.875,2.52 -1.725,2.52 -1.725,2.5 ; -1.475,-2.5 -1.475,-2.52 -1.325,-2.52 -1.325,-2.5 ; -1.475,2.5 -1.475,2.52 -1.325,2.52 -1.325,2.5 ; -1.075,-2.5 -1.075,-2.52 -0.925,-2.52 -0.925,-2.5 ; -1.075,2.5 -1.075,2.52 -0.925,2.52 -0.925,2.5 ; -0.675,-2.5 -0.675,-2.52 -0.525,-2.52 -0.525,-2.5 ; -0.675,2.5 -0.675,2.52 -0.525,2.52 -0.525,2.5 ; -0.275,-2.5 -0.275,-2.52 -0.125,-2.52 -0.125,-2.5 ; -0.275,2.5 -0.275,2.52 -0.125,2.52 -0.125,2.5 ; 0.125,-2.5 0.125,-2.52 0.275,-2.52 0.275,-2.5 ; 0.125,2.5 0.125,2.52 0.275,2.52 0.275,2.5 ; 0.525,-2.5 0.525,-2.52 0.675,-2.52 0.675,-2.5 ; 0.525,2.5 0.525,2.52 0.675,2.52 0.675,2.5 ; 0.925,-2.5 0.925,-2.52 1.075,-2.52 1.075,-2.5 ; 0.925,2.5 0.925,2.52 1.075,2.52 1.075,2.5 ; 1.325,-2.5 1.325,-2.52 1.475,-2.52 1.475,-2.5 ; 1.325,2.5 1.325,2.52 1.475,2.52 1.475,2.5 ; 1.725,-2.5 1.725,-2.52 1.875,-2.52 1.875,-2.5 ; 1.725,2.5 1.725,2.52 1.875,2.52 1.875,2.5 ; 2.5,-1.875 2.52,-1.875 2.52,-1.725 2.5,-1.725 ; 2.5,-1.475 2.52,-1.475 2.52,-1.325 2.5,-1.325 ; 2.5,-1.075 2.52,-1.075 2.52,-0.925 2.5,-0.925 ; 2.5,-0.675 2.52,-0.675 2.52,-0.525 2.5,-0.525 ; 2.5,-0.275 2.52,-0.275 2.52,-0.125 2.5,-0.125 ; 2.5,0.125 2.52,0.125 2.52,0.275 2.5,0.275 ; 2.5,0.525 2.52,0.525 2.52,0.675 2.5,0.675 ; 2.5,0.925 2.52,0.925 2.52,1.075 2.5,1.075 ; 2.5,1.325 2.52,1.325 2.52,1.475 2.5,1.475 ; 2.5,1.725 2.52,1.725 2.52,1.875 2.5,1.875 ; -2.5,-2.5 -2.5,2.5 2.5,2.5 2.5,-2.5 -2.5,-2.5
  text ".Designator" at -3.443,-0.467 h2
Top Text:
  lines w0.1: -0.5,0 0.5,0 ; 0,-0.5 0,0.5
3D body "QFN40_YT8531C.x_t": height 0.87, standoff 0, extent -2.52,-2.52 2.52,2.52

## QFN48_ESP32 [mm] "QFN48 5mm x 5mm, 0.35mm pitch"
pads (49):
  rect 0.6x0.2 smd paste-0.025 mask+0.05: 1(-2.45,2.275)
  rrect50% 0.6x0.2 smd paste-0.025 mask+0.05: 2(-2.45,1.925) 3(-2.45,1.575) 4(-2.45,1.225) 5(-2.45,0.875) 6(-2.45,0.525) 7(-2.45,0.175) 8(-2.45,-0.175) 9(-2.45,-0.525) 10(-2.45,-0.875) 11(-2.45,-1.225) 12(-2.45,-1.575) 13(-2.45,-1.925) 14(-2.45,-2.275) 25(2.45,-2.275) 26(2.45,-1.925) 27(2.45,-1.575) 28(2.45,-1.225) 29(2.45,-0.875) 30(2.45,-0.525) 31(2.45,-0.175) 32(2.45,0.175) 33(2.45,0.525) 34(2.45,0.875) 35(2.45,1.225) 36(2.45,1.575) 37(2.45,1.925) 38(2.45,2.275)
  rrect50% 0.2x0.6 smd paste-0.025 mask+0.05: 15(-1.575,-2.45) 16(-1.225,-2.45) 17(-0.875,-2.45) 18(-0.525,-2.45) 19(-0.175,-2.45) 20(0.175,-2.45) 21(0.525,-2.45) 22(0.875,-2.45) 23(1.225,-2.45) 24(1.575,-2.45) 39(1.575,2.45) 40(1.225,2.45) 41(0.875,2.45) 42(0.525,2.45) 43(0.175,2.45) 44(-0.175,2.45) 45(-0.525,2.45) 46(-0.875,2.45) 47(-1.225,2.45) 48(-1.575,2.45)
  rrect10% 3.75x3.75 smd paste-3 mask+0.05: EP(0,0)
Top Overlay:
  circle w0.2: c-3.125,2.275 r0.1
  lines w0.2: -2.675,-2.7 -1.85,-2.7 ; -2.675,2.7 -1.85,2.7 ; 1.85,-2.7 2.675,-2.7 ; 1.85,2.7 2.675,2.7
Top Paste:
  region: 0.7,0.7 0.1,0.7 0.1,0.1 0.7,0.1
  region: -0.1,0.7 -0.7,0.7 -0.7,0.1 -0.1,0.1
  region: 0.7,-0.1 0.1,-0.1 0.1,-0.7 0.7,-0.7
  region: -0.1,-0.1 -0.7,-0.1 -0.7,-0.7 -0.1,-0.7
  region: -0.9,0.7 -1.5,0.7 -1.5,0.1 -0.9,0.1
  region: -0.9,-0.1 -1.5,-0.1 -1.5,-0.7 -0.9,-0.7
  rectangle: 0.9,0.1 1.5,0.7
  rectangle: 0.9,-0.7 1.5,-0.1
  region: 0.7,1.5 0.1,1.5 0.1,0.9 0.7,0.9
  region: -0.1,1.5 -0.7,1.5 -0.7,0.9 -0.1,0.9
  region: -0.9,1.5 -1.5,1.5 -1.5,0.9 -0.9,0.9
  rectangle: 0.9,0.9 1.5,1.5
  region: 0.7,-0.9 0.1,-0.9 0.1,-1.5 0.7,-1.5
  region: -0.1,-0.9 -0.7,-0.9 -0.7,-1.5 -0.1,-1.5
  region: -0.9,-0.9 -1.5,-0.9 -1.5,-1.5 -0.9,-1.5
  rectangle: 0.9,-1.5 1.5,-0.9
Top Assy:
  drawing of 729 lines, arcs and shapes, not listed
  text ".Designator" at -3.443,-1.967 h2
3D body "QFN48_48L_SLP.x_b": height 0.87, standoff 0, extent -2.52,-2.52 2.52,2.52

## QFN64_LONTIUM [mm] "Power QFN 7.5mm x 7.5mm, 0.4mm pitch"
pads (65):
  rect 0.7x0.25 smd paste-0.025 mask+0.05: 1(-3.7,3)
  rrect50% 0.7x0.25 smd paste-0.025 mask+0.05: 2(-3.7,2.6) 3(-3.7,2.2) 4(-3.7,1.8) 5(-3.7,1.4) 6(-3.7,1) 7(-3.7,0.6) 8(-3.7,0.2) 9(-3.7,-0.2) 10(-3.7,-0.6) 11(-3.7,-1) 12(-3.7,-1.4) 13(-3.7,-1.8) 14(-3.7,-2.2) 15(-3.7,-2.6) 16(-3.7,-3) 33(3.7,-3) 34(3.7,-2.6) 35(3.7,-2.2) 36(3.7,-1.8) 37(3.7,-1.4) 38(3.7,-1) 39(3.7,-0.6) 40(3.7,-0.2) 41(3.7,0.2) 42(3.7,0.6) 43(3.7,1) 44(3.7,1.4) 45(3.7,1.8) 46(3.7,2.2) 47(3.7,2.6) 48(3.7,3)
  rrect50% 0.25x0.7 smd paste-0.025 mask+0.05: 17(-3,-3.7) 18(-2.6,-3.7) 19(-2.2,-3.7) 20(-1.8,-3.7) 21(-1.4,-3.7) 22(-1,-3.7) 23(-0.6,-3.7) 24(-0.2,-3.7) 25(0.2,-3.7) 26(0.6,-3.7) 27(1,-3.7) 28(1.4,-3.7) 29(1.8,-3.7) 30(2.2,-3.7) 31(2.6,-3.7) 32(3,-3.7) 49(3,3.7) 50(2.6,3.7) 51(2.2,3.7) 52(1.8,3.7) 53(1.4,3.7) 54(1,3.7) 55(0.6,3.7) 56(0.2,3.7) 57(-0.2,3.7) 58(-0.6,3.7) 59(-1,3.7) 60(-1.4,3.7) 61(-1.8,3.7) 62(-2.2,3.7) 63(-2.6,3.7) 64(-3,3.7)
  rrect5% 6.2x6.2 smd paste-4 mask+0.05: EP(0,0)
Top Overlay:
  circle w0.2: c-4.5,3 r0.1
  lines w0.2: -3.95,-3.45 -3.95,-3.95 -3.45,-3.95 ; -3.95,3.45 -3.95,3.95 -3.45,3.95 ; 3.45,-3.95 3.95,-3.95 3.95,-3.45 ; 3.45,3.95 3.95,3.95 3.95,3.45
Top Paste:
  region: 1.5,1.5 0.7,1.5 0.7,0.7 1.5,0.7
  region: 1.8,1.5 1.8,0.7 2.6,0.7 2.6,1.5
  rectangle: 1.8,1.8 2.6,2.6
  rectangle: 0.7,1.8 1.5,2.6
  region: -1.5,1.5 -1.5,0.7 -0.7,0.7 -0.7,1.5
  region: -0.4,1.5 -0.4,0.7 0.4,0.7 0.4,1.5
  rectangle: -0.4,1.8 0.4,2.6
  rectangle: -1.5,1.8 -0.7,2.6
  region: -1.8,1.8 -1.8,2.6 -2.6,2.6 -2.6,1.8
  region: -1.8,0.7 -1.8,1.5 -2.6,1.5 -2.6,0.7
  region: 1.5,-0.7 0.7,-0.7 0.7,-1.5 1.5,-1.5
  region: 1.5,-1.8 0.7,-1.8 0.7,-2.6 1.5,-2.6
  region: 1.8,-1.8 1.8,-2.6 2.6,-2.6 2.6,-1.8
  region: 1.8,-0.7 1.8,-1.5 2.6,-1.5 2.6,-0.7
  rectangle: 1.8,-0.4 2.6,0.4
  rectangle: 0.7,-0.4 1.5,0.4
  rectangle: -0.4,-2.6 0.4,-1.8
  rectangle: -0.4,-1.5 0.4,-0.7
  rectangle: -1.5,-1.5 -0.7,-0.7
  rectangle: -1.5,-2.6 -0.7,-1.8
  region: -2.6,-1.8 -2.6,-2.6 -1.8,-2.6 -1.8,-1.8
  region: -2.6,-0.7 -2.6,-1.5 -1.8,-1.5 -1.8,-0.7
  region: -1.8,0.4 -2.6,0.4 -2.6,-0.4 -1.8,-0.4
  region: -0.7,0.4 -1.5,0.4 -1.5,-0.4 -0.7,-0.4
  region: 0.4,0.4 -0.4,0.4 -0.4,-0.4 0.4,-0.4
Top Assy:
  drawing of 197 lines, arcs and shapes, not listed
  text ".Designator" at -3.443,-1.967 h2
3D body "QFN64_Lontium.x_t": height 0.8, standoff 0, extent -3.775,-3.775 3.775,3.775

## QFN68_RK8xx [mm] "Power QFN 7mm x 7mm, 0.35mm pitch, for RockChip PMIC RK8xx"
pads (69):
  rect 0.6x0.2 smd paste-0.025 mask+0.05: 1(-3.4,2.8)
  rrect50% 0.6x0.2 smd paste-0.025 mask+0.05: 2(-3.4,2.45) 3(-3.4,2.1) 4(-3.4,1.75) 5(-3.4,1.4) 6(-3.4,1.05) 7(-3.4,0.7) 8(-3.4,0.35) 9(-3.4,0) 10(-3.4,-0.35) 11(-3.4,-0.7) 12(-3.4,-1.05) 13(-3.4,-1.4) 14(-3.4,-1.75) 15(-3.4,-2.1) 16(-3.4,-2.45) 17(-3.4,-2.8) 35(3.4,-2.8) 36(3.4,-2.45) 37(3.4,-2.1) 38(3.4,-1.75) 39(3.4,-1.4) 40(3.4,-1.05) 41(3.4,-0.7) 42(3.4,-0.35) 43(3.4,0) 44(3.4,0.35) 45(3.4,0.7) 46(3.4,1.05) 47(3.4,1.4) 48(3.4,1.75) 49(3.4,2.1) 50(3.4,2.45) 51(3.4,2.8)
  rrect50% 0.2x0.6 smd paste-0.025 mask+0.05: 18(-2.8,-3.4) 19(-2.45,-3.4) 20(-2.1,-3.4) 21(-1.75,-3.4) 22(-1.4,-3.4) 23(-1.05,-3.4) 24(-0.7,-3.4) 25(-0.35,-3.4) 26(0,-3.4) 27(0.35,-3.4) 28(0.7,-3.4) 29(1.05,-3.4) 30(1.4,-3.4) 31(1.75,-3.4) 32(2.1,-3.4) 33(2.45,-3.4) 34(2.8,-3.4) 52(2.8,3.4) 53(2.45,3.4) 54(2.1,3.4) 55(1.75,3.4) 56(1.4,3.4) 57(1.05,3.4) 58(0.7,3.4) 59(0.35,3.4) 60(0,3.4) 61(-0.35,3.4) 62(-0.7,3.4) 63(-1.05,3.4) 64(-1.4,3.4) 65(-1.75,3.4) 66(-2.1,3.4) 67(-2.45,3.4) 68(-2.8,3.4)
  rrect5% 5.6x5.6 smd paste-3 mask+0.05: EP(0,0)
Top Overlay:
  circle w0.2: c-4.2,2.8 r0.1
  lines w0.2: -3.7,-3.2 -3.7,-3.7 -3.2,-3.7 ; -3.7,3.2 -3.7,3.7 -3.2,3.7 ; 3.2,-3.7 3.7,-3.7 3.7,-3.2 ; 3.2,3.7 3.7,3.7 3.7,3.2
Top Paste:
  region: 0.9,2.3 0.9,1.7 1.5,1.7 1.5,2.3
  region: 0.1,2.3 0.1,1.7 0.7,1.7 0.7,2.3
  region: -0.7,2.3 -0.7,1.7 -0.1,1.7 -0.1,2.3
  region: 0.1,1.5 0.1,0.9 0.7,0.9 0.7,1.5
  region: 1.7,1.5 1.7,0.9 2.3,0.9 2.3,1.5
  region: 1.7,0.7 1.7,0.1 2.3,0.1 2.3,0.7
  region: 1.7,-0.1 1.7,-0.7 2.3,-0.7 2.3,-0.1
  region: 1.7,-0.9 1.7,-1.5 2.3,-1.5 2.3,-0.9
  region: 0.9,0.7 0.9,0.1 1.5,0.1 1.5,0.7
  region: 1.5,-0.1 0.9,-0.1 0.9,-0.7 1.5,-0.7
  region: 2.3,-1.7 1.7,-1.7 1.7,-2.3 2.3,-2.3
  region: 1.5,-1.7 0.9,-1.7 0.9,-2.3 1.5,-2.3
  region: 0.7,-1.7 0.1,-1.7 0.1,-2.3 0.7,-2.3
  region: -0.1,-1.7 -0.7,-1.7 -0.7,-2.3 -0.1,-2.3
  region: 0.7,-0.9 0.1,-0.9 0.1,-1.5 0.7,-1.5
  region: 1.5,-0.9 0.9,-0.9 0.9,-1.5 1.5,-1.5
  region: -0.9,-2.3 -0.9,-1.7 -1.5,-1.7 -1.5,-2.3
  region: -0.1,-1.5 -0.1,-0.9 -0.7,-0.9 -0.7,-1.5
  region: -1.7,-2.3 -1.7,-1.7 -2.3,-1.7 -2.3,-2.3
  region: -0.9,-1.5 -0.9,-0.9 -1.5,-0.9 -1.5,-1.5
  region: -1.7,-1.5 -1.7,-0.9 -2.3,-0.9 -2.3,-1.5
  region: -1.7,-0.7 -1.7,-0.1 -2.3,-0.1 -2.3,-0.7
  region: -1.7,0.1 -1.7,0.7 -2.3,0.7 -2.3,0.1
  region: -1.7,0.9 -1.7,1.5 -2.3,1.5 -2.3,0.9
  region: -0.9,-0.7 -0.9,-0.1 -1.5,-0.1 -1.5,-0.7
  region: -0.9,0.1 -0.9,0.7 -1.5,0.7 -1.5,0.1
  rectangle: -1.5,1.7 -0.9,2.3
  rectangle: -0.7,0.9 -0.1,1.5
  rectangle: -2.3,1.7 -1.7,2.3
  rectangle: -1.5,0.9 -0.9,1.5
  region: 2.3,2.3 1.7,2.3 1.7,1.7 2.3,1.7
  region: 1.5,1.5 0.9,1.5 0.9,0.9 1.5,0.9
  region: -0.1,-0.1 -0.7,-0.1 -0.7,-0.7 -0.1,-0.7
  region: 0.7,-0.1 0.1,-0.1 0.1,-0.7 0.7,-0.7
  region: -0.1,0.7 -0.7,0.7 -0.7,0.1 -0.1,0.1
  region: 0.7,0.7 0.1,0.7 0.1,0.1 0.7,0.1
Top Assy:
  drawing of 700 lines, arcs and shapes, not listed
  text ".Designator" at -3.443,-1.967 h2
3D body "QFN68_RK808.x_t": height 0.78, standoff -0.01, extent -3.525,-3.525 3.525,3.525

## QSOP16_WCH [mm] "QSOP-16 with 0.635mm pitch"
height 1
pads (16):
  rect 0.32x1.1 smd paste+0 mask+0.05: 1(-2.223,-2.7)
  oval 0.32x1.1 smd paste+0 mask+0.05: 2(-1.588,-2.7) 3(-0.953,-2.7) 4(-0.318,-2.7) 5(0.317,-2.7) 6(0.952,-2.7) 7(1.587,-2.7) 8(2.222,-2.7) 9(2.222,2.7) 10(1.587,2.7) 11(0.952,2.7) 12(0.317,2.7) 13(-0.318,2.7) 14(-0.953,2.7) 15(-1.588,2.7) 16(-2.222,2.7)
Top Overlay:
  circle w0.25: c-2.9,-2.7 r0.125
  rectangle: -2.3,-1.8 -1.3,-0.8
  lines w0.2: -2.3,-1.8 -2.3,1.8 2.3,1.8 2.3,-1.8 -2.3,-1.8
Top Assy:
  drawing of 285 lines, arcs and shapes, not listed
  text ".Designator" at -3.443,-0.467 h2
3D body "QSOP16.x_t": height 1.55, standoff 0, extent -2.45,-3 2.45,3

## QSOP28_WCH [mm] "QSOP-28 with 0.635mm pitch"
height 1
pads (28):
  rect 0.32x1.1 smd paste+0 mask+0.05: 1(-4.128,-2.7)
  oval 0.32x1.1 smd paste+0 mask+0.05: 2(-3.493,-2.7) 3(-2.858,-2.7) 4(-2.223,-2.7) 5(-1.588,-2.7) 6(-0.953,-2.7) 7(-0.318,-2.7) 8(0.317,-2.7) 9(0.952,-2.7) 10(1.587,-2.7) 11(2.222,-2.7) 12(2.857,-2.7) 13(3.492,-2.7) 14(4.127,-2.7) 15(4.127,2.7) 16(3.492,2.7) 17(2.857,2.7) 18(2.222,2.7) 19(1.587,2.7) 20(0.952,2.7) 21(0.317,2.7) 22(-0.318,2.7) 23(-0.953,2.7) 24(-1.588,2.7) 25(-2.223,2.7) 26(-2.858,2.7) 27(-3.493,2.7) 28(-4.127,2.7)
Top Overlay:
  circle w0.25: c-4.127,-3.81 r0.125
  rectangle: -4.8,-1.8 -3.8,-0.8
  lines w0.2: -4.8,-1.8 4.8,-1.8 4.8,1.8 -4.8,1.8 -4.8,-1.8
Top Assy:
  drawing of 489 lines, arcs and shapes, not listed
  text ".Designator" at -3.443,-0.467 h2
3D body "QSOP28.x_t": height 1.55, standoff 0, extent -4.95,-3 4.95,3